# Altium footprint library My Library Second Part .PcbLib: 61 footprints (part 2 of 4)
Each footprint in its own frame and in the unit in brackets; x right, y up, seen from the top. Pads: shape width x height; smd on the part's side, far side on the other; paste and mask are expansions set on the pad; w line width, h text height; cw(c..) or ccw(c..) is an arc to the next point about the centre after c.
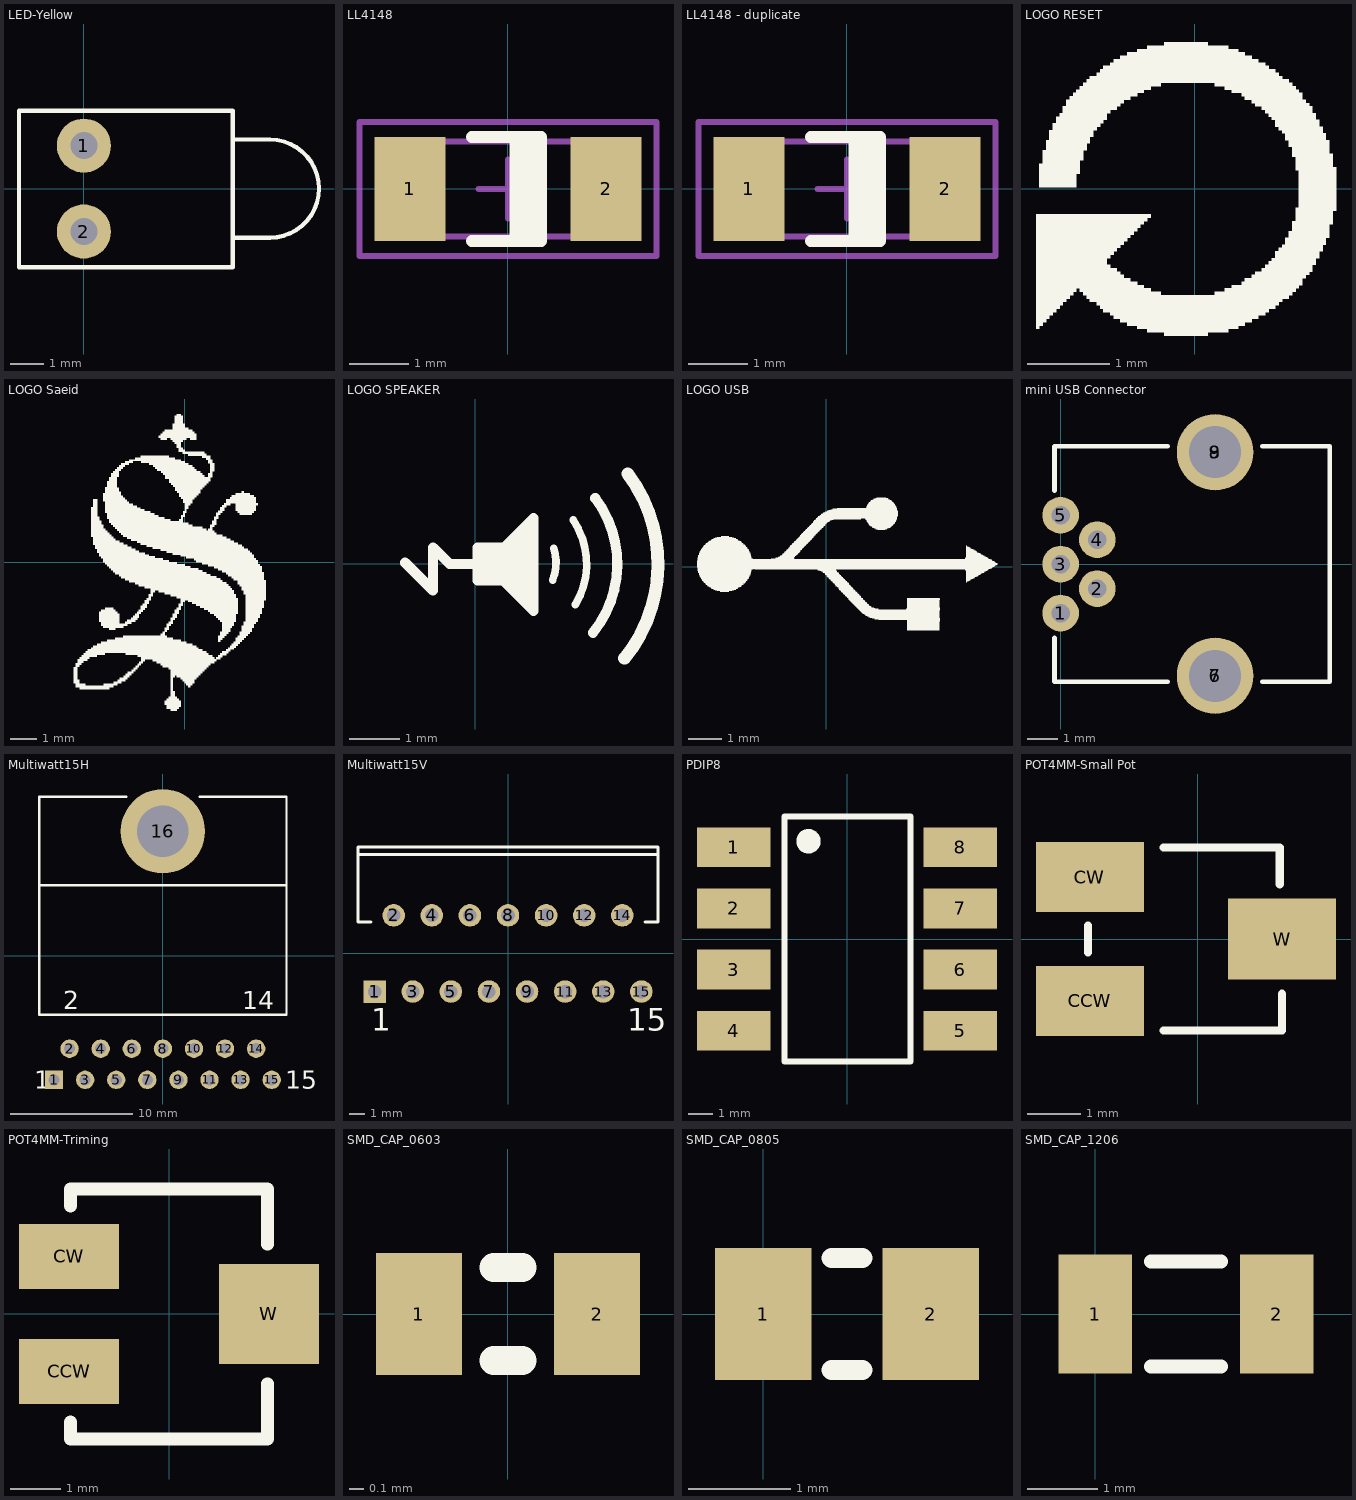
[diagram p1: the footprints below, top view; thin cyan lines are the x and y axes]

## LED-Yellow [mm] "LED 3mm Right Angle - Color Yellow"
pads (2):
  round 1.6 hole 0.8: 1(0,1.27) 2(0,-1.27)
Top Overlay:
  lines w0.127: 4.4,-1.45 5.5,-1.45 ccw(c5.5,0) 5.5,1.45 4.4,1.45 ; -1.918,-2.323 -1.918,2.3 4.4,2.3 4.4,-2.323 -1.918,-2.323
3D body "LEDd3YC-Yellow.STEP": height 7.31, standoff -2.49, extent -1.927,-2.323 6.832,2.3

## LL4148 [mm] "MELF Diode, 2-Leads, Body 3.5x1.4mm, IPC Medium Density"
height 1.6
pads (2):
  rect 1.2x1.75 smd: 1(-1.65,0) 2(1.65,0)
Top Overlay:
  region: 0.573,0.875 0.023,0.875 0.023,-0.875 0.573,-0.875
  lines w0.2: -0.61,-0.875 0.559,-0.875 0.559,0.875 -0.61,0.875
Mechanical 13:
  rectangle: -1.85,-0.8 -1.352,0.8
  lines w0.1: -1.85,-0.8 -1.85,0.8 1.85,0.8 1.85,-0.8 -1.85,-0.8
Mechanical 15:
  lines w0.1: -0.5,0 0.5,0 ; 0,-0.5 0,0.5 ; -2.5,-1.125 -2.5,1.125 2.5,1.125 2.5,-1.125 -2.5,-1.125
3D body "User Library-Diode MELF.STEP": height 1.55, standoff 0.05, extent -1.775,-0.75 1.725,0.75

## LL4148 - duplicate [mm] "MELF Diode, 2-Leads, Body 3.5x1.4mm, IPC Medium Density"
height 1.6
pads (2):
  rect 1.2x1.75 smd: 1(-1.65,0) 2(1.65,0)
Top Overlay:
  region: 0.573,0.875 0.023,0.875 0.023,-0.875 0.573,-0.875
  lines w0.2: -0.61,-0.875 0.559,-0.875 0.559,0.875 -0.61,0.875
Mechanical 13:
  rectangle: -1.85,-0.8 -1.352,0.8
  lines w0.1: -1.85,-0.8 -1.85,0.8 1.85,0.8 1.85,-0.8 -1.85,-0.8
Mechanical 15:
  lines w0.1: -0.5,0 0.5,0 ; 0,-0.5 0,0.5 ; -2.5,-1.125 -2.5,1.125 2.5,1.125 2.5,-1.125 -2.5,-1.125
3D body "User Library-Diode MELF.STEP": height 1.55, standoff 0.05, extent -1.775,-0.75 1.725,0.75

## LOGO RESET [mm]
Top Overlay:
  drawing of 1 lines, arcs and shapes, not listed

## LOGO Saeid [mm]
Top Overlay:
  drawing of 3 lines, arcs and shapes, not listed
Top Solder:
  drawing of 3 lines, arcs and shapes, not listed

## LOGO SPEAKER [mm]
Top Overlay:
  lines w0.152: 1.552,-0.324 ccw(c0.686,0.025) 1.574,0.314 ; 1.964,0.879 cw(c0.66,0) 2.008,-0.81
  lines w0.203: -1.397,0.025 -0.838,-0.533 -0.838,0.33 -0.508,0 0,0 ; 0.102,-0.178 0.508,-0.178 ; 0.102,-0.025 0.559,-0.025 ; 0.102,0.152 0.66,0.152 ; 0.508,-0.33 0.051,-0.33 0.051,0.33 0.559,0.33 0.559,-0.33 1.168,-0.94 1.168,0.914 0.559,0.305 ; 0.914,-0.432 0.914,0.432 ; 0.965,-0.508 0.737,-0.279 0.737,0.279 1.067,0.61 1.067,-0.66 ; 2.359,-1.376 ccw(c0.66,0) 2.406,1.315
  lines w0.254: 2.991,-1.888 ccw(c0.66,0) 3.056,1.805

## LOGO USB [mm]
Top Overlay:
  drawing of 1 lines, arcs and shapes, not listed

## mini USB Connector [mm]
pads (9):
  round 1.2 hole 0.6: 1(0,-1.6) 2(1.2,-0.8) 3(0,0) 4(1.2,0.8) 5(0,1.6)
  round 2.5 hole 1.7: 6(5.05,-3.65) 7(5.05,-3.65) 8(5.05,3.66) 9(5.05,3.66)
Top Overlay:
  lines w0.15: -0.2,-2.4 -0.2,-3.85 3.5,-3.85 ; -0.2,2.4 -0.2,3.85 3.5,3.85 ; 6.6,-3.85 8.8,-3.85 8.8,3.85 6.6,3.85
3D body "Samtec-DEFAULT.STEP": height 5.8, standoff -1.8, extent 4.64,-5.588 51.24,5.212
3D body "5877.STEP": height 3.95, standoff -1.8, extent -0.2,-3.85 8.8,3.85

## Multiwatt15H [mm] "TO, Thru-Hole, Horizontal, Heatsink Mounted; 15 Bent Staggered Leads; Pitch 1.27 mm"
height 5
pads (16):
  rect 1.5x1.5 hole 0.9: 1(-8.89,-10.155)
  round 1.5 hole 0.9: 2(-7.62,-7.615) 3(-6.35,-10.155) 4(-5.08,-7.615) 5(-3.81,-10.155) 6(-2.54,-7.615) 7(-1.27,-10.155) 8(0,-7.615) 9(1.27,-10.155) 10(2.54,-7.615) 11(3.81,-10.155) 12(5.08,-7.615) 13(6.35,-10.155) 14(7.62,-7.615) 15(8.89,-10.155)
  round 6.9 hole 4.2: 16(0,10.155)
Top Overlay:
  lines w0.2: -10.1,5.755 10.1,5.755 ; -3,12.955 -10.1,12.955 -10.1,-4.845 10.1,-4.845 10.1,12.955 3,12.955
  text "1" at -10.515,-10.905 h1.5
  text "15" at 10.015,-10.905 h1.5
  text "14" at 6.495,-4.37 h1.5
  text "2" at -8.12,-4.37 h1.5

## Multiwatt15V [mm] "TO, Thru-Hole, Vertical, Heatsink Mounted; 15 Bent Staggered Leads; Pitch 1.27 mm"
height 21
pads (15):
  rect 1.5x1.5 hole 0.9: 1(-8.89,-2.54)
  round 1.5 hole 0.9: 2(-7.62,2.54) 3(-6.35,-2.54) 4(-5.08,2.54) 5(-3.81,-2.54) 6(-2.54,2.54) 7(-1.27,-2.54) 8(0,2.54) 9(1.27,-2.54) 10(2.54,2.54) 11(3.81,-2.54) 12(5.08,2.54) 13(6.35,-2.54) 14(7.62,2.54) 15(8.89,-2.54)
Top Overlay:
  lines w0.2: -10,6.59 10,6.59 ; -9.144,2.09 -10,2.09 -10,7.09 10,7.09 10,2.09 9.144,2.09
  text "1" at -9.12,-5.165 h1.5
  text "15" at 7.94,-5.165 h1.5

## PDIP8 [mil] "DIP8 SMD Package"
pads (8):
  rect 120x65 smd: 1(-185,150) 2(-185,50) 3(-185,-50) 4(-185,-150) 5(185,-150) 6(185,-50) 7(185,50) 8(185,150)
Top Overlay:
  circle w20: c-62.92,159.64 r10
  lines w10: -102,-200 -102,200 104,200 104,-200 -102,-200
3D body "SW3dPS-pdip8-smd.STEP": height 200, standoff 0, extent -202.75,-195.08 202.76,195.08

## POT4MM-Small Pot [mm] "Square Trimming Potentiometer"
pads (3):
  rect 2x1.3 smd: CCW(-2,-1.15) CW(-2,1.15)
  rect 2x1.5 smd: W(1.568,0)
Top Overlay:
  lines w0.15: -2.032,-0.254 -2.032,0.254 ; -0.635,-1.7 1.568,-1.7 1.568,-1.016 ; -0.635,1.7 1.524,1.7 1.524,1.016
3D body "TRIMMER_PVG3A.STEP": height 2, standoff 0, extent -2.032,-1.7 1.568,1.7

## POT4MM-Triming [mm] "Square Trimming Potentiometer"
pads (3):
  rect 2x1.3 smd: CCW(-2,-1.15) CW(-2,1.15)
  rect 2x2 smd: W(2,0)
Top Overlay:
  lines w0.254: -1.97,-2.159 -1.97,-2.5 1.97,-2.5 1.97,-1.397 ; -1.97,2.159 -1.97,2.5 1.97,2.5 1.97,1.397
3D body "SW3dPS-Pot 3214.STEP": height 5.4, standoff 0, extent -1.97,-2.4 1.97,2.4

## SMD_CAP_0603 [mm]
pads (2):
  rect 0.6x0.85 smd: 1(-0.622,0) 2(0.622,0)
Top Overlay:
  lines w0.2: -0.1,-0.325 0.1,-0.325 ; -0.1,0.325 0.1,0.325
3D body "cap 0603.STEP": height 0.6, standoff 0, extent -0.762,-0.381 0.762,0.381

## SMD_CAP_0805 [mm]
pads (2):
  rect 0.95x1.3 smd: 1(0,0) 2(1.65,0)
Top Overlay:
  lines w0.2: 0.675,-0.55 0.975,-0.55 ; 0.675,0.55 0.975,0.55
3D body "cap 0805.STEP": height 0.65, standoff 0, extent -0.191,-0.635 1.841,0.635

## SMD_CAP_1206 [mm]
pads (2):
  rect 1.05x1.7 smd: 1(0,0) 2(2.596,0)
Top Overlay:
  lines w0.2: 0.798,-0.75 1.798,-0.75 ; 0.798,0.75 1.798,0.75
3D body "cap 1206.STEP": height 0.75, standoff 0, extent -0.224,-0.775 2.824,0.749